# Altium footprint library THU VIEN PCB.PCBLib: 534 footprints (part 22 of 34)
Each footprint in its own frame and in the unit in brackets; x right, y up, seen from the top. Pads: shape width x height; smd on the part's side, far side on the other; paste and mask are expansions set on the pad; w line width, h text height; cw(c..) or ccw(c..) is an arc to the next point about the centre after c.
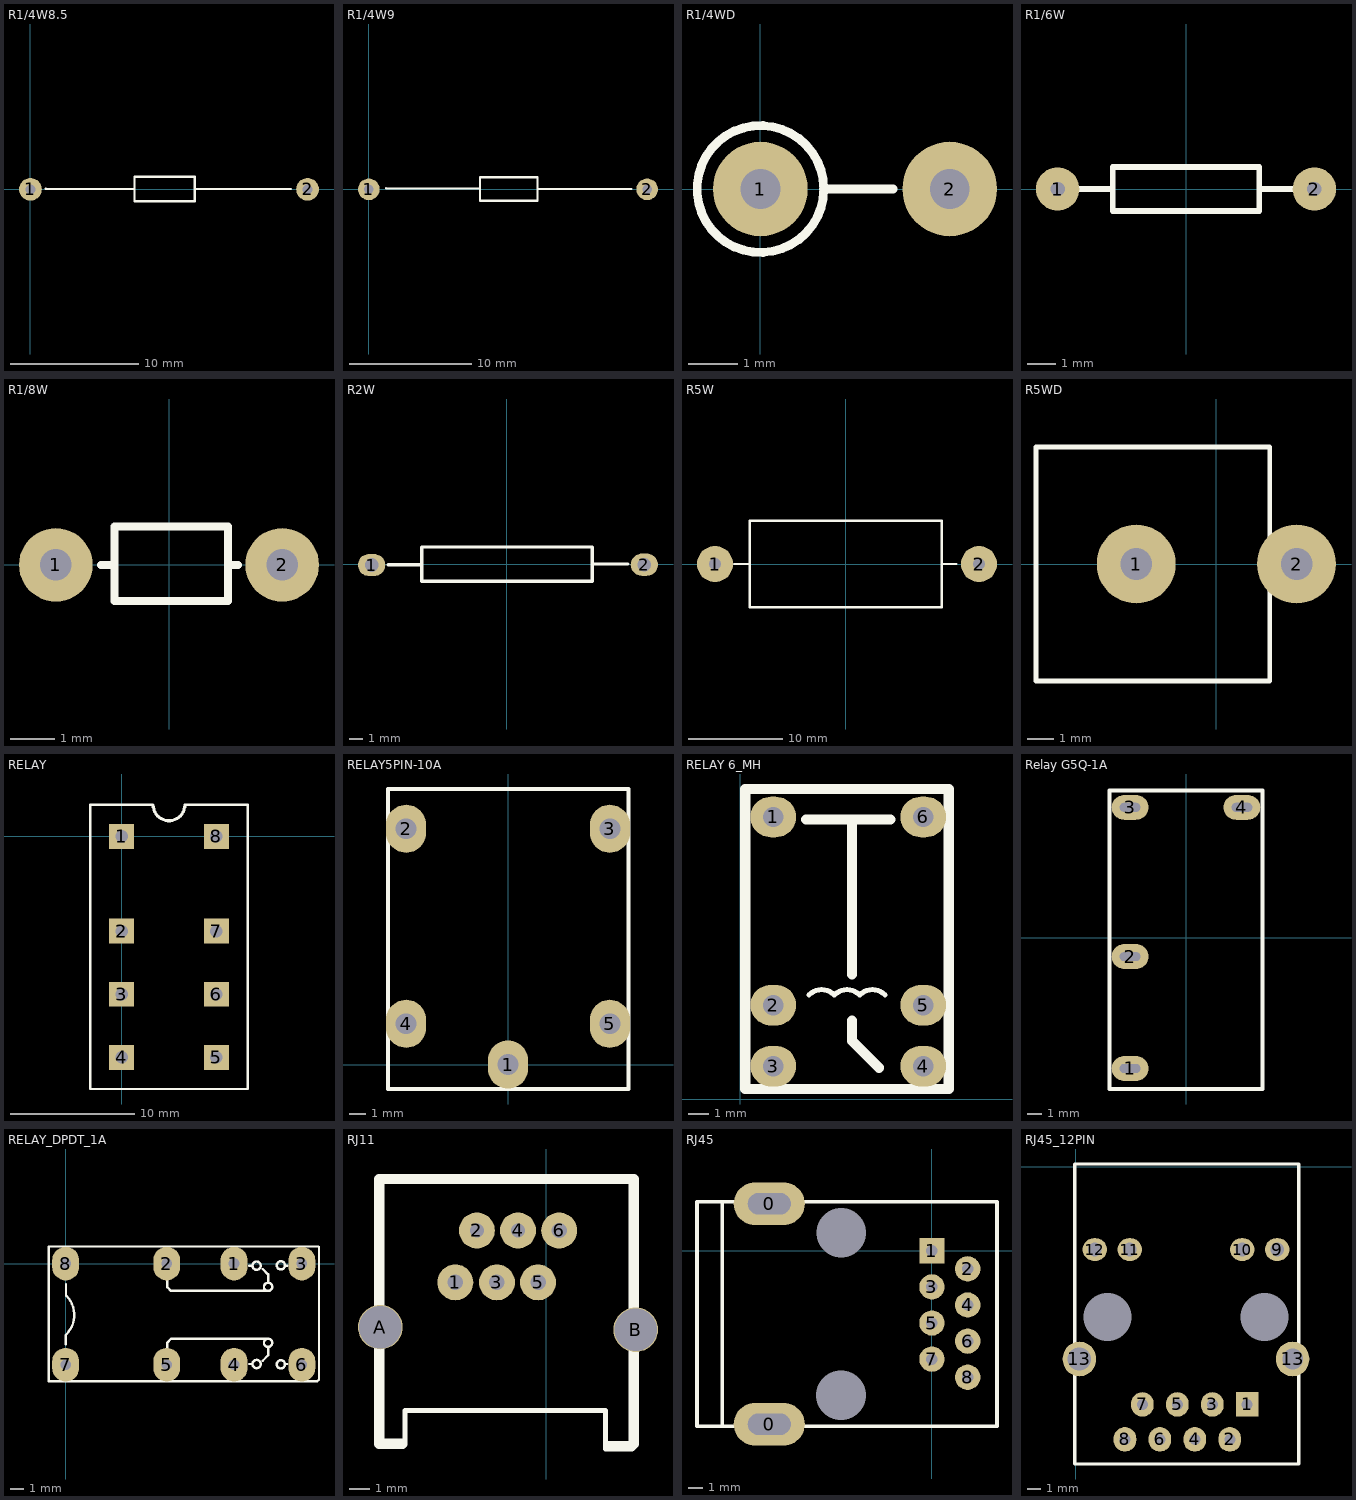
[diagram p21: the footprints below, top view; thin cyan lines are the x and y axes]

## R1/4W8.5 [mil] "R 1/4W, 2 Pin, 600mil"
height 100
pads (2):
  round 70 hole 31: 1(0,0) 2(850,0)
Top Overlay:
  lines w7: 47,2.11 319,1 ; 504,1 799,1 ; 319,-37 319,39 504,39 504,-37 319,-37

## R1/4W9 [mil] "R 1/4W, 2 Pin, 600mil"
height 100
pads (2):
  round 70 hole 31: 1(0,0) 2(900,0)
Top Overlay:
  lines w7: 56.01,3.24 360,2 ; 545,1 849,1 ; 360,-37 360,39 545,39 545,-37 360,-37

## R1/4WD [mm] "R 1/4W, 2 Pin, 150mil"
height 2.54
pads (2):
  round 1.905 hole 0.8: 1(0,0) 2(3.81,0)
Top Overlay:
  circle w0.178: c0,0 r1.276
  lines w0.178: 1.27,0 2.667,0
3D body "SW3DPS-0_5W METAL FILM RESISTOR-DEFAULT.STEP": height 13.42, standoff -4.28, extent -1.778,-1.7 4.322,1.7

## R1/6W [mm]
height 1.524
pads (2):
  round 1.5 hole 0.5: 1(-4.445,0) 2(4.445,0)
Top Overlay:
  lines w0.2: -3.81,0 -2.54,0 ; 3.81,0 2.54,0 ; 2.54,0 2.54,-0.762 -2.54,-0.762 -2.54,0.762 2.54,0.762 2.54,0

## R1/8W [mil] "R 1/8W, 2 pin, 300mil"
height 100
pads (2):
  round 65 hole 28: 1(-100,0) 2(100,0)
Top Overlay:
  lines w7: -60,0 -48,0 ; 54,0 61,0 ; -48,-32 52,-32 52,34 -48,34 -48,-32
3D body "SW3dPS-Res_Normal (0.25W).STEP": height 86.31, standoff -68.11, extent -135,-35.48 135,37

## R2W [mil] "dien tro 2W"
height 10
pads (2):
  oval 80x65 hole 40: 1(-397,-3) 2(403,-2)
Top Overlay:
  lines w10: -349,-2 -250,-2 -250,-50 250,-50 250,50 -250,50 -250,0 -251,-1 ; 250,0 354,0
3D body "RES-2W.STEP": height 216.54, standoff -118.11, extent -413.78,-110 413.78,106.54

## R5W [mil] "dien tro 5W"
pads (2):
  round 150 hole 50: 1(-545,0) 2(555,0)
Top Overlay:
  lines w10: -465,0 -400,0 ; 400,0 460,0 ; -400,-180 400,-180 400,180 -400,180 -400,-180
3D body "Tro 5W.step": height 354.93, standoff -141.13, extent -559.53,-191.85 570,201.85

## R5WD [mm] "R5W , 2 pin, 300 x 600 mil"
height 10.16
pads (2):
  round 3 hole 1.2: 1(-3.048,0) 2(3.048,0)
Top Overlay:
  lines w0.178: -6.858,-4.445 2.032,-4.445 2.032,4.445 -6.858,4.445 -6.858,-4.445
3D body "SW3dPS-5W Res.STEP": height 23.05, standoff -2.4, extent -8.648,-5.08 4.432,4.92

## RELAY [mm]
pads (8):
  rect 2x2 hole 1: 1(0,0) 2(0,-7.62) 3(0,-12.7) 4(0,-17.78) 5(7.62,-17.78) 6(7.62,-12.7) 7(7.62,-7.62) 8(7.62,0)
Top Overlay:
  lines w0.2: 2.413,2.54 -2.54,2.54 -2.54,-20.32 10.16,-20.32 10.16,2.54 5.08,2.54
  lines w0.254: 2.534,2.54 ccw(c3.81,2.54) 5.086,2.54
3D body "SW3dPS-DSY2Y.STEP": height 12.3, standoff -3, extent -1.09,-19.29 8.71,1.51

## RELAY5PIN-10A [mm]
pads (5):
  oval 2.5x3 hole 1.3: 1(0,0) 2(-6.35,14.7) 3(6.35,14.7) 4(-6.35,2.54) 5(6.35,2.54)
Top Overlay:
  lines w0.254: -7.493,-1.524 -7.493,17.176 7.507,17.176 7.507,-1.524 -7.493,-1.524
3D body: height 16, standoff 0, extent -7.493,-1.524 7.493,17.145

## RELAY 6_MH [mil] "RELAY 6"
pads (6):
  oval 90x80 hole 40: 1(65,555) 2(65,185) 3(65,65) 4(360,65) 5(360,185) 6(360,555)
Top Overlay:
  lines w10: 135,205 cw(c160,180) 185,205 cw(c210,180) 235,205 cw(c260,180) 285,205
  lines w20: 130,550 295,550 ; 220,120 220,155 ; 220,245 220,550 ; 220.1,116 220.1,114.5 272.9,61.7 ; 10,20 410,20 410,610 10,610 10,20
3D body "Part1.stp": height 453.36, standoff 0.6, extent 10.08,22.69 403.78,613.24

## Relay G5Q-1A [mm]
pads (4):
  oval 2.5x1.7 hole 0.6 slot 1.4 at 0 deg: 1(-3.81,-8.89) 2(-3.81,-1.27) 3(-3.81,8.89) 4(3.81,8.89)
Top Overlay:
  lines w0.254: -5.207,-10.287 5.207,-10.287 5.207,10.033 -5.207,10.033 -5.207,-10.287
3D body "Relay G5Q-1A.stp": height 16.21, standoff -3.39, extent -5.093,-10.267 5.207,10.033

## RELAY_DPDT_1A [mil] "Reley DPDT, 8 pin, 1A, W400mil, L800mil,H 300mil"
height 300
pads (8):
  oval 80x100 hole 32: 1(500,0) 2(300,0) 3(701,0) 4(500,-300) 5(300,-300) 6(701,-300) 7(0,-300) 8(0,0)
Top Overlay:
  circle w7: c638.76,-299 r12.24
  circle w7: c566.76,-298 r12.24
  circle w7: c600.76,-235 r12.24
  circle w7: c600.76,-69 r12.24
  circle w7: c566.76,-6 r12.24
  circle w7: c638.76,-5 r12.24
  lines w7: 0,-239 0,-212 ; 1,-211 ccw(c-56.5,-152.5) 2,-95 ; 1,-94 1,-61 ; 302,-255 302,-234 313,-223 599,-223 ; 302,-42 302,-70 313,-81 599,-81 ; 544,-298 552,-298 ; 544,-6 552,-6 ; 585,-288 601,-272 601,-249 ; 585,-16 601,-32 601,-55 ; 653,-298 658,-298 ; 653,-6 658,-6 ; -50,-349 -50,51 750,51 752,49 752,-344 747,-349 -50,-349
3D body "SW3dPS-DSY2Y.STEP": height 484.25, standoff -118.11, extent -59.45,-340 759.45,45.83

## RJ11 [mil]
pads (8):
  round 70 hole 30 unplated: 1(-177,-301) 3(-96,-301)
  round 70 hole 27.56 unplated: 2(-135,-200) 4(-55,-200)
  round 70 hole 30: 5(-16,-301) 6(25,-200)
  round 86.61 hole 82.68 unplated: A(-323,-388) B(174,-393)
Top Overlay:
  lines w10: -275,-610 -275,-550 -255,-550 -225,-550 60,-550 100,-550 105,-550 115,-550 115,-625
  lines w20: -325,-615 -325,-100 170,-100 170,-615 ; -320,-615 -280,-615 ; 120,-620 165,-620
3D body "RJ11.step": height 571.47, standoff -137.2, extent -358.46,-626.22 208.47,-114.41

## RJ45 [mil]
pads (12):
  oval 196.85x118.11 hole 59.06 slot 118.11 at 0 deg: 0(-450,-480) 0(-450,130)
  rect 70x70 hole 31.5 unplated: 1(0,0)
  round 70 hole 31.5 unplated: 2(99,-50) 3(0,-100) 4(99,-150) 5(0,-200) 6(99,-250) 7(0,-300) 8(99,-350)
  round 70 hole 137.8 unplated: ""(-252,-400) ""(-251,50)
Top Overlay:
  lines w10: -580,-480 -580,130 ; -375,135.04 -306,135.04 ; -650,-485.04 -650,135.04 -509,135.04 -414,135.04 50,135.04 148.37,135.04 180,135.03 180,-485.04 148,-485.04 50,-485.04 -408,-485.04 -510,-485.04 -650,-485.04
3D body "RJ45_NO_LED.step": height 527.05, standoff -124.33, extent -675.59,-484.68 153.08,144.69

## RJ45_12PIN [mm]
pads (16):
  rect 1.651x1.778 hole 0.8 unplated: 1(12.45,-17.27)
  oval 1.651x1.778 hole 0.8 unplated: 2(11.18,-19.81) 3(9.91,-17.27) 4(8.64,-19.81) 5(7.37,-17.27) 6(6.1,-19.81) 7(4.83,-17.27) 8(3.56,-19.81)
  oval 1.778x1.651 hole 1: 9(14.625,-6.02) 10(12.085,-6.02) 11(3.915,-6.02) 12(1.375,-6.02)
  oval 2.424x2.525 hole 1.7: 13(0.255,-13.97)
  oval 2.424x2.525 hole 1.5: 13(15.745,-13.97)
  oval 1.651x1.778 hole 3.5 unplated: ""(2.285,-10.92) ""(13.715,-10.92)
Top Overlay:
  lines w0.254: -0.1,-21.6 -0.1,0.2 16.2,0.2 16.2,-21.6 -0.1,-21.6
3D body "User Library-HR911105A.STEP": height 13.51, standoff -2.99, extent 0.1,-21.4 15.98,0